# Altium integrated library lpi-nano-dock.IntLib: 16 symbols
Pins are listed as number, name and electrical type; pins without a type are passive.

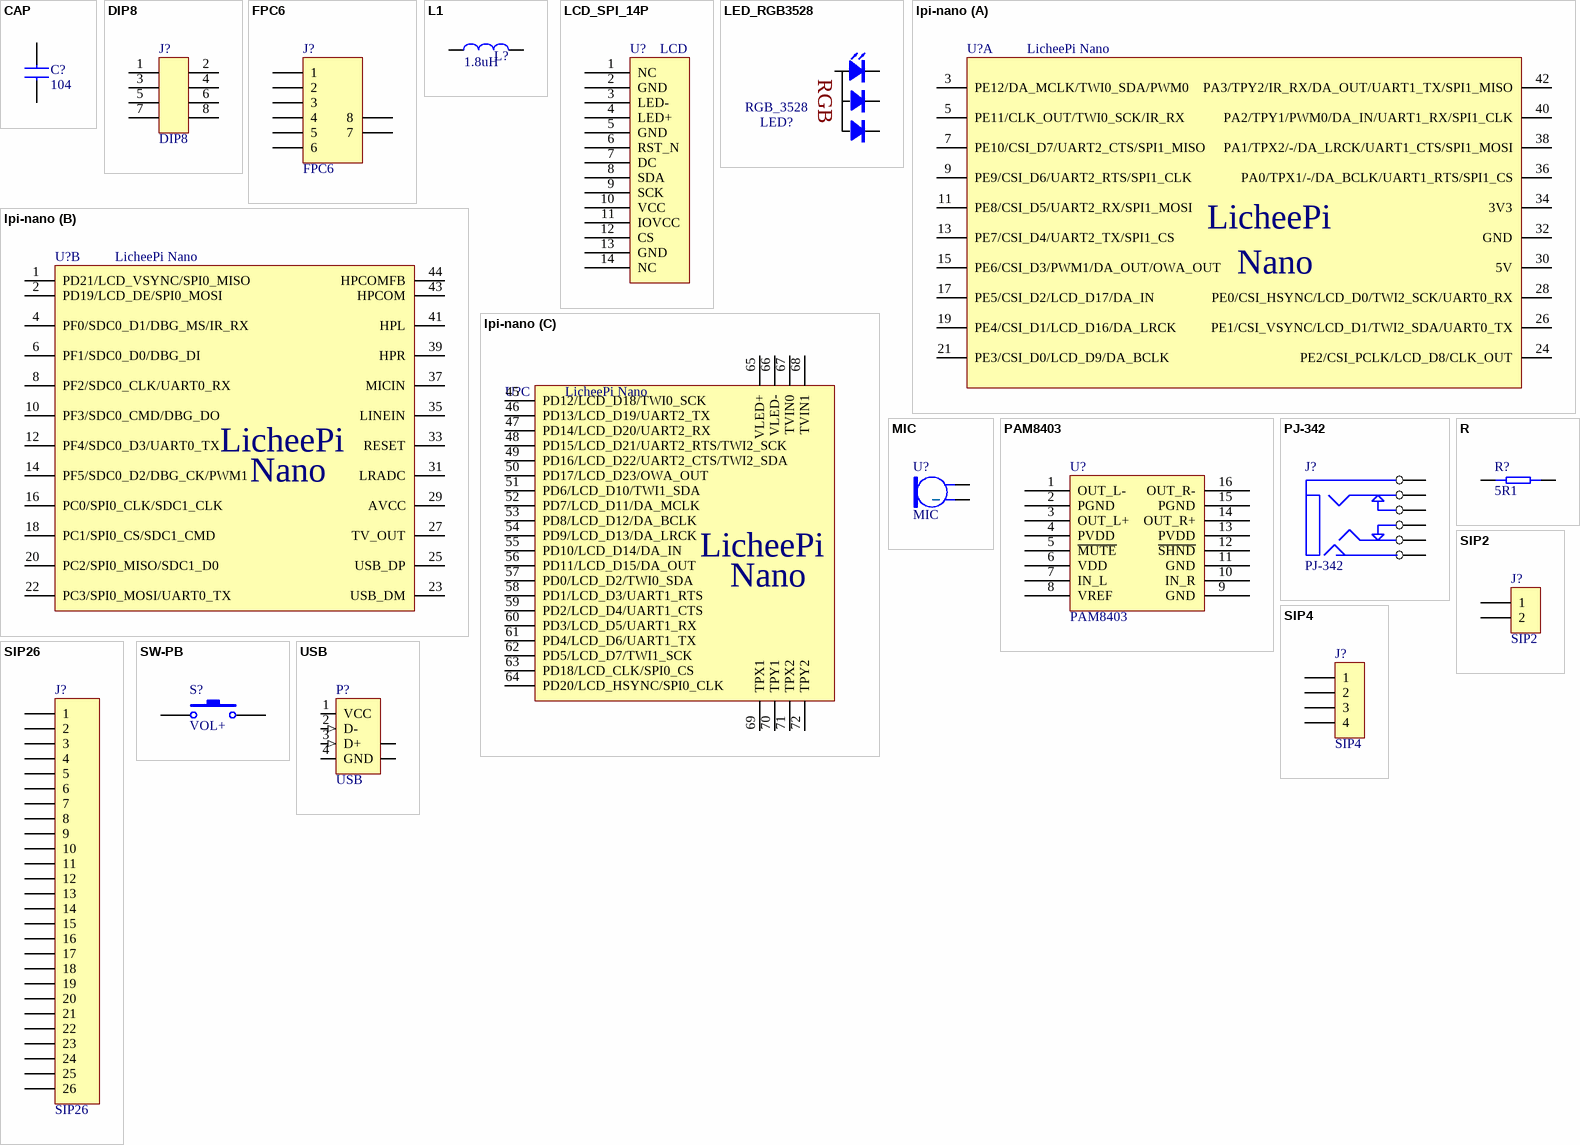
[diagram p0: symbols CAP to USB]

## CAP
designator C?, comment 104
SMD-CAP
footprint 0603C
footprint 0805C
footprint 1206C
footprint C_CCB
footprint 0402C
pins: 1, 2

## DIP8
designator J?
Connectors; Set Position: 0.5; Published: 8-Jun-2000; LatestRevisionDate: 17-Jul-2002; LatestRevisionNote: Re-released for DXP Platform.; PackageReference: AXIAL-0.6; Publisher: Altium Limited
footprint DIP8-2.54 (Footprint not found)
footprint NRF24L01
footprint DIP8-2.54_SMT
pins: 1, 2, 3, 4, 5, 6, 7, 8

## FPC6
designator J?
footprint FPC-6P-0.5
pins: 1, 2, 3, 4, 5, 6, 7, 8

## L1
designator L?, comment 1.8uH
电感
footprint SLF10145
footprint SLF12565
footprint CD32
footprint CD43
footprint NR3015
footprint 0805R
footprint 0603R
pins: 1, 2

## LCD_SPI_14P
designator U?, comment LCD
footprint LCD_SPI_14P
footprint LCD_SPI_14P_top
footprint LCD_SPI_14P_sim
footprint LCD_SPI_14P_top_1.8
pins: 1 NC, 2 GND, 3 LED-, 4 LED+, 5 GND, 6 RST_N, 7 DC, 8 SDA, 9 SCK, 10 VCC, 11 IOVCC, 12 CS, 13 GND, 14 NC

## LED_RGB3528
designator LED?, comment RGB_3528
footprint LED_RGB3528
pins: 1 R, 2 COM+, 3 G, 4 B
text: RGB

## lpi-nano
designator U?, comment LicheePi Nano
footprint lpi-nano
footprint lpi-nano-dip
part A pins: 3 PE12/DA_MCLK/TWI0_SDA/PWM0, 5 PE11/CLK_OUT/TWI0_SCK/IR_RX, 7 PE10/CSI_D7/UART2_CTS/SPI1_MISO, 9 PE9/CSI_D6/UART2_RTS/SPI1_CLK, 11 PE8/CSI_D5/UART2_RX/SPI1_MOSI, 13 PE7/CSI_D4/UART2_TX/SPI1_CS, 15 PE6/CSI_D3/PWM1/DA_OUT/OWA_OUT, 17 PE5/CSI_D2/LCD_D17/DA_IN, 19 PE4/CSI_D1/LCD_D16/DA_LRCK, 21 PE3/CSI_D0/LCD_D9/DA_BCLK, 24 PE2/CSI_PCLK/LCD_D8/CLK_OUT, 26 PE1/CSI_VSYNC/LCD_D1/TWI2_SDA/UART0_TX, 28 PE0/CSI_HSYNC/LCD_D0/TWI2_SCK/UART0_RX, 30 5V, 32 GND, 34 3V3, 36 PA0/TPX1/-/DA_BCLK/UART1_RTS/SPI1_CS, 38 PA1/TPX2/-/DA_LRCK/UART1_CTS/SPI1_MOSI, 40 PA2/TPY1/PWM0/DA_IN/UART1_RX/SPI1_CLK, 42 PA3/TPY2/IR_RX/DA_OUT/UART1_TX/SPI1_MISO
part B pins: 1 PD21/LCD_VSYNC/SPI0_MISO, 2 PD19/LCD_DE/SPI0_MOSI, 4 PF0/SDC0_D1/DBG_MS/IR_RX, 6 PF1/SDC0_D0/DBG_DI, 8 PF2/SDC0_CLK/UART0_RX, 10 PF3/SDC0_CMD/DBG_DO, 12 PF4/SDC0_D3/UART0_TX, 14 PF5/SDC0_D2/DBG_CK/PWM1, 16 PC0/SPI0_CLK/SDC1_CLK, 18 PC1/SPI0_CS/SDC1_CMD, 20 PC2/SPI0_MISO/SDC1_D0, 22 PC3/SPI0_MOSI/UART0_TX, 23 USB_DM, 25 USB_DP, 27 TV_OUT, 29 AVCC, 31 LRADC, 33 RESET, 35 LINEIN, 37 MICIN, 39 HPR, 41 HPL, 43 HPCOM, 44 HPCOMFB
part C pins: 45 PD12/LCD_D18/TWI0_SCK, 46 PD13/LCD_D19/UART2_TX, 47 PD14/LCD_D20/UART2_RX, 48 PD15/LCD_D21/UART2_RTS/TWI2_SCK, 49 PD16/LCD_D22/UART2_CTS/TWI2_SDA, 50 PD17/LCD_D23/OWA_OUT, 51 PD6/LCD_D10/TWI1_SDA, 52 PD7/LCD_D11/DA_MCLK, 53 PD8/LCD_D12/DA_BCLK, 54 PD9/LCD_D13/DA_LRCK, 55 PD10/LCD_D14/DA_IN, 56 PD11/LCD_D15/DA_OUT, 57 PD0/LCD_D2/TWI0_SDA, 58 PD1/LCD_D3/UART1_RTS, 59 PD2/LCD_D4/UART1_CTS, 60 PD3/LCD_D5/UART1_RX, 61 PD4/LCD_D6/UART1_TX, 62 PD5/LCD_D7/TWI1_SCK, 63 PD18/LCD_CLK/SPI0_CS, 64 PD20/LCD_HSYNC/SPI0_CLK, 65 VLED+, 66 VLED-, 67 TVIN0, 68 TVIN1, 69 TPX1, 70 TPY1, 71 TPX2, 72 TPY2
part A text: LicheePi; Nano
part B text: LicheePi; Nano
part C text: LicheePi; Nano

## MIC
designator U?
footprint SIP2-2.54
footprint MIC_6050
footprint MIC_6027
pins: 1, 2

## PAM8403
designator U?
footprint SO-16N
pins: 1 OUT_L-, 2 PGND, 3 OUT_L+, 4 PVDD, 5 ~{MUTE}, 6 VDD, 7 IN_L, 8 VREF, 9 GND, 10 IN_R, 11 GND, 12 ~{SHND}, 13 PVDD, 14 OUT_R+, 15 PGND, 16 OUT_R-

## PJ-342
designator J?
footprint PJ-342
pins: 2 MIC, 3 GND, 4 R, 5 R_DET, 6 L, 7 L_DET

## R
designator R?, comment 5R1
footprint 0805R
footprint R-AXIAL0.3
footprint R-AXIAL0.4
footprint 0402R
pins: 1, 2

## SIP2
designator J?
jointbar
footprint SIP2-2.0
footprint SIP2-2.54
pins: 1, 2

## SIP4
designator J?
jointbar
footprint SIP4-2.0
footprint SIP4-2.54
footprint SIP4-2.54-raw
pins: 1, 2, 3, 4

## SIP26
designator J?
footprint DIP26_2.54_SMT-DUAL
pins: 1, 2, 3, 4, 5, 6, 7, 8, 9, 10, 11, 12, 13, 14, 15, 16, 17, 18, 19, 20, 21, 22, 23, 24, 25, 26

## SW-PB
designator S?, comment VOL+
Switch; Published: 24-Mar-1999; LatestRevisionDate: 17-Jul-2002; LatestRevisionNote: Re-released for DXP Platform.; PackageReference: SPST-2; Publisher: Altium Limited
footprint SPST-2 (Switch; 2 Leads)
footprint key2_3*4
footprint KEY_6X6X5
footprint key4_3x4
pins: 1, 2

## USB
designator P?
USB 1.1, Right Angle, SMT, A Type, Plug, 4 Position, Natural; ContactMaterial: Brass; ContactPlating: Gold (30) over Nickel (50); PCB_Layout: Complies with manufacturer's recommendation.; DrillSize: Corresponds to nominal value.; PanelGround: Without; Published: 15-Jul-2004; DatasheetDocument: 21-Jan-2003; PackageDocument: 21-Jan-2003; PackageReference: 1470695A; Publisher: Altium Limited; HousingMaterial: Thermoplastic; ComponentLink1Description: Manufacturer Link; ComponentLink1URL: http://www.tycoelectronics.com/; ComponentLink2Description: Packaging Specification; ComponentLink2URL: http://ecommas.tycoelectronics.com/commerce/DocumentDelivery/DDEController?Action=showdoc&DocId=Customer+Drawing%7F1470695%7FO%7Fpdf%7FEnglish%7FC_1470695_O.pdf
footprint USB01 (Connector; USB1.1, Type A, SM; 4 Position; Right Angle)
signal-integrity model USB1.1
footprint USBB
pins: 1 VCC (power) "Power", 2 D- (in) "-DATA", 3 D+ (in) "+DATA", 4 GND (power) "Ground", 5 SHLD "Shield", 6 SHLD "Shield"